# Altium footprint library En.PcbLib: 157 footprints (part 9 of 10)
Each footprint in its own frame and in the unit in brackets; x right, y up, seen from the top. Pads: shape width x height; smd on the part's side, far side on the other; paste and mask are expansions set on the pad; w line width, h text height; cw(c..) or ccw(c..) is an arc to the next point about the centre after c.
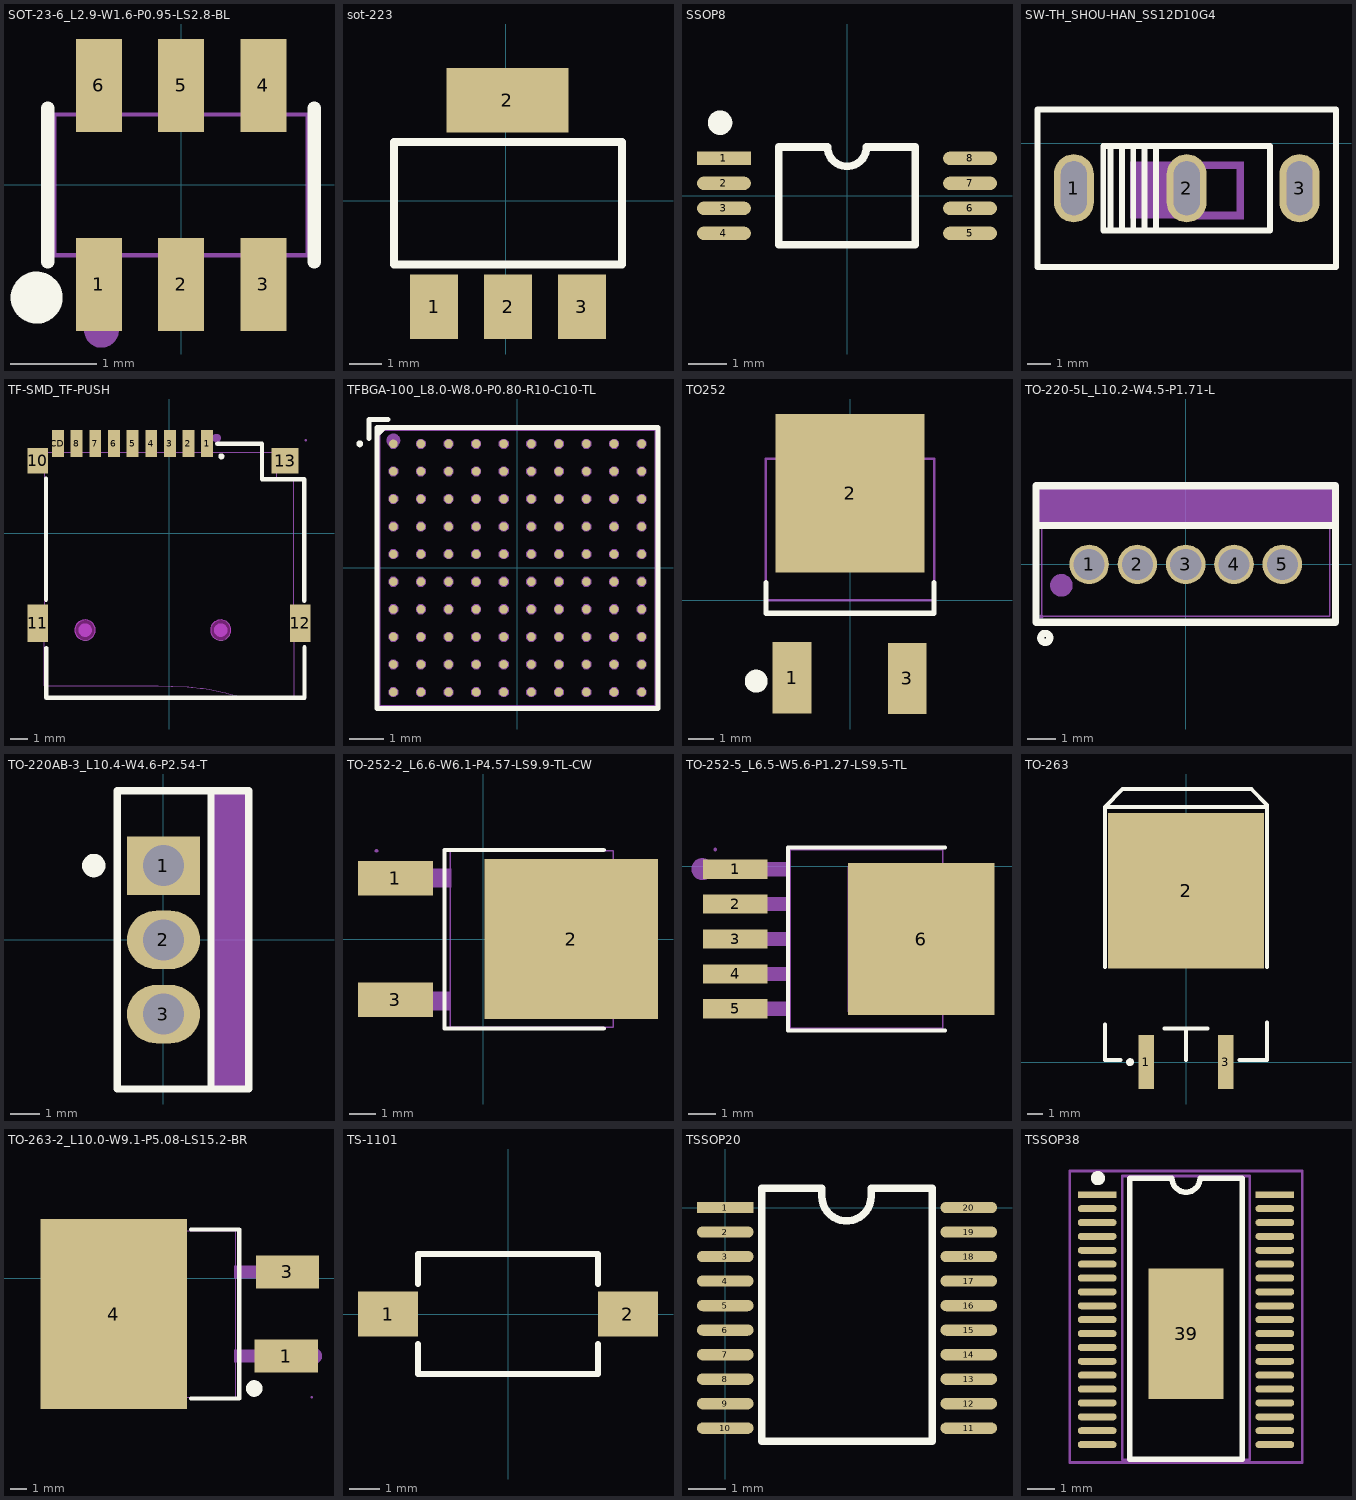
[diagram p8: the footprints below, top view; thin cyan lines are the x and y axes]

## SOT-23-6_L2.9-W1.6-P0.95-LS2.8-BL [mm]
pads (6):
  rect 0.532x1.072 smd: 1(-0.95,-1.149) 2(0,-1.149) 3(0.95,-1.149) 4(0.95,1.149) 5(0,1.149) 6(-0.95,1.149)
Top Overlay:
  circle w0.3: c-1.668,-1.301 r0.15
  lines w0.152: -1.539,-0.889 -1.539,0.889 ; 1.539,-0.889 1.539,0.889
Mechanical 6:
  circle w0.2: c-0.92,-1.68 r0.1
Mechanical 15:
  region: -1.403,-1.4 -1.404,-1.376 -1.439,-1.341 -1.488,-1.341 -1.522,-1.376 -1.523,-1.4 -1.522,-1.425 -1.487,-1.459 -1.438,-1.459 -1.404,-1.424
  region: -1.165,-0.925 -0.735,-0.925 -0.735,-1.4 -1.165,-1.4
  region: -1.165,-0.803 -0.735,-0.803 -0.735,-0.935 -1.165,-0.935
  region: -0.215,-0.925 0.215,-0.925 0.215,-1.4 -0.215,-1.4
  region: -0.215,-0.803 0.215,-0.803 0.215,-0.935 -0.215,-0.935
  region: 0.735,-0.925 1.165,-0.925 1.165,-1.4 0.735,-1.4
  region: 0.735,-0.803 1.165,-0.803 1.165,-0.935 0.735,-0.935
  region: 0.735,0.925 1.165,0.925 1.165,1.4 0.735,1.4
  region: 0.735,0.935 1.165,0.935 1.165,0.803 0.735,0.803
  region: -0.215,0.925 0.215,0.925 0.215,1.4 -0.215,1.4
  region: -0.215,0.935 0.215,0.935 0.215,0.803 -0.215,0.803
  region: -1.165,0.925 -0.735,0.925 -0.735,1.4 -1.165,1.4
  region: -1.165,0.935 -0.735,0.935 -0.735,0.803 -1.165,0.803
  lines w0.051: -1.463,-0.813 1.463,-0.813 1.463,0.813 -1.463,0.813 -1.463,-0.813
3D body "User Library-SOT-23-6.SLDPRT": height 1.09, standoff 0, extent -1.397,-1.213 1.397,1.213

## sot-223 [mil]
pads (4):
  rect 59x79 smd: 1(-88,-130) 2(2.55,-130) 3(93.1,-130)
  rect 150x79 smd: 2(1.88,123.54)
Top Overlay:
  lines w10: -137.45,-78 142.55,-78 142.55,72 -137.45,72 -137.45,-78
3D body "SOT-223_MP04A.STEP": height 66.93, standoff 0, extent -126.41,-138.72 129.5,135.3

## SSOP8 [mm] "3*6.4*1.2mm（蒜米工坊）"
height 9.4
pads (8):
  rect 1.4x0.35 smd: 1(-3.2,0.975)
  oval 1.4x0.35 smd: 2(-3.2,0.325) 3(-3.2,-0.325) 4(-3.2,-0.975) 5(3.2,-0.975) 6(3.2,-0.325) 7(3.2,0.325) 8(3.2,0.975)
Top Overlay:
  circle w0.381: c-3.3,1.9 r0.127
  lines w0.2: -1.778,-1.27 1.778,-1.27 1.778,1.27 0.508,1.27 cw(c0,1.27) -0.508,1.27 -1.778,1.27 -1.778,-1.27
3D body "SSOP8.STEP": height 1.25, standoff -0.03, extent -3.202,-1.75 3.202,1.75

## SW-TH_SHOU-HAN_SS12D10G4 [mm]
pads (3):
  oval 1.7x2.9 hole 1.1 slot 2.3 at 90 deg paste-2539.97 mask+0.05: 1(23.327,-1.924) 2(28.127,-1.924) 3(32.927,-1.924)
Top Overlay:
  lines w0.254: 24.885,-3.724 24.894,-3.724 24.894,-0.124 ; 25.365,-3.724 25.374,-3.724 25.374,-0.124 ; 25.844,-3.724 25.854,-3.724 25.854,-0.124 ; 26.324,-3.724 26.334,-3.724 26.334,-0.124 ; 26.813,-0.124 26.813,-3.724 26.87,-3.724 ; 30.444,-0.124 30.867,-0.124 ; 30.577,-0.124 24.577,-0.124 24.577,-3.724 31.677,-3.724 31.677,-0.624 31.677,-0.124 30.677,-0.124 ; 21.777,-5.274 34.477,-5.274 34.477,1.426 21.777,1.426 21.777,-5.274
Mechanical 6:
  region: 28.107,-3.225 28.107,-0.825 28.107,-0.787 28.411,-0.787 28.411,-3.227 28.311,-3.227
  region: 28.106,-2.931 30.506,-2.931 30.543,-2.931 30.543,-3.235 28.104,-3.235 28.104,-3.134
  region: 30.251,-3.235 30.251,-0.835 30.251,-0.797 30.555,-0.797 30.555,-3.237 30.454,-3.237
  region: 28.114,-0.795 30.514,-0.795 30.552,-0.795 30.552,-1.098 28.112,-1.098 28.112,-0.998
  region: 25.727,-0.794 28.127,-0.794 28.127,-3.194 25.727,-3.194
Mechanical 15:
  region: 32.527,-1.274 33.327,-1.274 33.327,-2.574 32.527,-2.574
  region: 27.727,-1.274 28.527,-1.274 28.527,-2.574 27.727,-2.574
  region: 22.927,-1.274 23.727,-1.274 23.727,-2.574 22.927,-2.574
  region: 21.837,-5.274 21.837,-5.249 21.802,-5.214 21.752,-5.214 21.717,-5.249 21.717,-5.274 21.717,-5.299 21.752,-5.334 21.802,-5.334 21.837,-5.299
  lines w0.051: 21.777,-5.274 34.477,-5.274 34.477,1.426 21.777,1.426 21.777,-5.274
3D body "User Library-SS-12D10L4.step": height 10.1, standoff -7, extent 21.567,-5.276 34.567,1.524

## TF-SMD_TF-PUSH [mm]
pads (13):
  rect 0.7x1.6 smd: 1(2.25,5.3) 2(1.15,5.3) 3(0.05,5.3) 4(-1.05,5.3) 5(-2.15,5.3) 6(-3.25,5.3) 7(-4.35,5.3) 8(-5.45,5.3) CD(-6.55,5.3)
  rect 1.2x1.5 smd: 10(-7.75,4.3)
  rect 1.2x2.2 smd: 11(-7.75,-5.3) 12(7.75,-5.3)
  rect 1.6x1.5 smd: 13(6.85,4.3)
Top Overlay:
  circle w0.254: c3.087,4.552 r0.052
  lines w0.254: -7.26,-3.91 -7.26,3.25 ; -7.24,-6.76 -7.24,-9.7 8,-9.7 8,-6.71 ; 2.85,5.3 4.702,5.3 5.489,5.3 5.489,3.199 5.5,3.2 ; 5.49,3.2 7.98,3.2 7.98,-3.969
Keep-Out Layer:
  board cut-out: 3.65,-5.7 3.65,-5.581 3.559,-5.36 3.39,-5.191 3.169,-5.1 2.931,-5.1 2.71,-5.191 2.541,-5.36 2.45,-5.581 2.45,-5.7 2.45,-5.819 2.541,-6.04 2.71,-6.209 2.931,-6.3 3.169,-6.3 3.39,-6.209 3.559,-6.04 3.65,-5.819
  board cut-out: -4.35,-5.7 -4.35,-5.581 -4.441,-5.36 -4.61,-5.191 -4.831,-5.1 -5.069,-5.1 -5.29,-5.191 -5.459,-5.36 -5.55,-5.581 -5.55,-5.7 -5.55,-5.819 -5.459,-6.04 -5.29,-6.209 -5.069,-6.3 -4.831,-6.3 -4.61,-6.209 -4.441,-6.04 -4.35,-5.819
Mechanical 1:
  circle w0.005: c3.05,-5.7 r0.6
  circle w0.005: c-4.95,-5.7 r0.6
Mechanical 6:
  circle w0.254: c2.81,5.63 r0.127
  circle w0.4: c-4.95,-5.7 r0.2
  circle w0.4: c3.05,-5.7 r0.2
Mechanical 15:
  region: 8.069,-6.092 8.068,-4.492 7.369,-4.492 7.369,-6.091 7.429,-6.091
  region: -7.369,-6.094 -7.37,-4.494 -8.069,-4.494 -8.069,-6.094 -8.009,-6.094
  region: 6.481,3.805 7.181,3.805 7.181,4.805 6.494,4.805 6.469,4.806 6.472,4.752 6.473,4.671 6.474,4.498
  region: -7.37,3.806 -8.069,3.806 -8.07,4.806 -7.383,4.806 -7.382,4.805 -7.384,4.498
  region: 2.1,5.505 2.4,5.505 2.4,4.805 2.1,4.805
  region: 1,5.505 1.3,5.505 1.3,4.805 1,4.805
  region: -0.1,5.505 0.2,5.505 0.2,4.805 -0.1,4.805
  region: -1.2,5.505 -0.9,5.505 -0.9,4.805 -1.2,4.805
  region: -2.3,5.505 -2,5.505 -2,4.805 -2.3,4.805
  region: -3.4,5.505 -3.1,5.505 -3.1,4.805 -3.4,4.805
  region: -4.5,5.505 -4.2,5.505 -4.2,4.805 -4.5,4.805
  region: -5.6,5.505 -5.3,5.505 -5.3,4.805 -5.6,4.805
  region: -6.7,5.505 -6.4,5.505 -6.4,4.805 -6.7,4.805
  region: 8.13,5.505 8.129,5.529 8.094,5.562 8.046,5.562 8.011,5.529 8.01,5.505 8.011,5.481 8.046,5.448 8.094,5.448 8.129,5.481
  lines w0.051: -8.07,4.806 7.181,4.806 ; -8.07,4.806 -8.07,4.806 ; -8.07,4.806 -8.07,3.806 -7.37,3.806 -7.37,-4.494 -8.07,-4.494 -8.07,-6.094 -7.37,-6.094 -7.37,-8.994 -6.352,-8.995 -2.476,-8.986 -1.695,-8.99 -0.648,-8.989 0.138,-8.999 0.232,-9.003 1.09,-9.042 1.163,-9.05 1.308,-9.069 1.414,-9.075 1.841,-9.121 2.012,-9.136 2.38,-9.204 3.048,-9.34 3.176,-9.371 3.348,-9.403 3.411,-9.421 3.876,-9.552 4.14,-9.628 4.388,-9.695 4.389,-9.694 7.379,-9.694 7.38,-9.693 7.38,-6.094 8.07,-6.094 ; 7.181,4.806 7.181,3.806 7.181,3.806 6.33,3.806 6.33,3.306 7.229,3.306 7.229,3.206 7.37,3.206 7.37,-4.494 7.37,-4.494 8.069,-4.494 8.07,-4.495 8.07,-6.094 ; 7.181,4.806 7.181,4.806 ; 8.07,-6.094 8.07,-6.094
3D body "User Library-MEM2055-00-190-01-A_revG.SLDPRT": height 1.85, standoff -0.6, extent -8.066,-9.652 7.934,5.598

## TFBGA-100_L8.0-W8.0-P0.80-R10-C10-TL [mm]
pads (100):
  round 0.25 smd paste+0 mask+0.038: A1(-3.6,3.6) A2(-2.8,3.6) A3(-2,3.6) A4(-1.2,3.6) A5(-0.4,3.6) A6(0.4,3.6) A7(1.2,3.6) A8(2,3.6) A9(2.8,3.6) A10(3.6,3.6) B1(-3.6,2.8) B2(-2.8,2.8) B3(-2,2.8) B4(-1.2,2.8) B5(-0.4,2.8) B6(0.4,2.8) B7(1.2,2.8) B8(2,2.8) B9(2.8,2.8) B10(3.6,2.8) C1(-3.6,2) C2(-2.8,2) C3(-2,2) C4(-1.2,2) C5(-0.4,2) C6(0.4,2) C7(1.2,2) C8(2,2) C9(2.8,2) C10(3.6,2) D1(-3.6,1.2) D2(-2.8,1.2) D3(-2,1.2) D4(-1.2,1.2) D5(-0.4,1.2) D6(0.4,1.2) D7(1.2,1.2) D8(2,1.2) D9(2.8,1.2) D10(3.6,1.2) E1(-3.6,0.4) E2(-2.8,0.4) E3(-2,0.4) E4(-1.2,0.4) E5(-0.4,0.4) E6(0.4,0.4) E7(1.2,0.4) E8(2,0.4) E9(2.8,0.4) E10(3.6,0.4) F1(-3.6,-0.4) F2(-2.8,-0.4) F3(-2,-0.4) F4(-1.2,-0.4) F5(-0.4,-0.4) F6(0.4,-0.4) F7(1.2,-0.4) F8(2,-0.4) F9(2.8,-0.4) F10(3.6,-0.4) G1(-3.6,-1.2) G2(-2.8,-1.2) G3(-2,-1.2) G4(-1.2,-1.2) G5(-0.4,-1.2) G6(0.4,-1.2) G7(1.2,-1.2) G8(2,-1.2) G9(2.8,-1.2) G10(3.6,-1.2) H1(-3.6,-2) H2(-2.8,-2) H3(-2,-2) H4(-1.2,-2) H5(-0.4,-2) H6(0.4,-2) H7(1.2,-2) H8(2,-2) H9(2.8,-2) H10(3.6,-2) J1(-3.6,-2.8) J2(-2.8,-2.8) J3(-2,-2.8) J4(-1.2,-2.8) J5(-0.4,-2.8) J6(0.4,-2.8) J7(1.2,-2.8) J8(2,-2.8) J9(2.8,-2.8) J10(3.6,-2.8) K1(-3.6,-3.6) K2(-2.8,-3.6) K3(-2,-3.6) K4(-1.2,-3.6) K5(-0.4,-3.6) K6(0.4,-3.6) K7(1.2,-3.6) K8(2,-3.6) K9(2.8,-3.6) K10(3.6,-3.6)
Top Overlay:
  circle w0.1: c-4.576,3.6 r0.05
  region: -4.076,4.076 -3.756,4.076 -4.076,3.756
  lines w0.152: -4.305,3.756 -4.305,4.305 -3.756,4.305 ; -4.076,-4.076 4.076,-4.076 4.076,4.076 -4.076,4.076 -4.076,-4.076
Mechanical 6:
  circle w0.2: c-3.6,3.7 r0.1
  region: -4.076,4.076 -3.756,4.076 -4.076,3.756
Mechanical 15:
  drawing of 105 lines, arcs and shapes, not listed
3D body "stm32h723vgh6.step": height 1.1, standoff 0, extent -4,-4 4,4

## TO252 [mil] "252晶体管"
height 370.08
pads (3):
  rect 60x110 smd: 1(-89.55,-119.77) 3(88.45,-120.77)
  rect 230x245 smd: 2(0,165.35)
Top Overlay:
  circle w19.68: c-145,-125 r7.87
  lines w7.87: -130,27.56 -130,-20 130,-20 130,27.56
Mechanical 15:
  lines w3.94: -105.04,218.5 -105.04,236.06 -65.59,271.65 65.59,271.65 105.04,236.06 105.04,218.5 ; -130,0 130,0 130,218.5 -130,218.5 -130,0
3D body "TO252.STEP": height 90.55, standoff -0.2, extent -127.95,-120 127.95,250.84

## TO-220-5L_L10.2-W4.5-P1.71-L [mm]
pads (5):
  round 1.4 hole 1.1: 1(-3.42,0) 2(-1.71,0) 3(0,0) 4(1.71,0) 5(3.42,0)
Top Overlay:
  circle w0.254: c-4.97,-2.6 r0.16
  lines w0.258: -5.3,1.38 5.3,1.38 ; -5.3,-2.05 -5.3,2.78 5.3,2.78 5.3,-2.05 -5.3,-2.05
Mechanical 6:
  circle w0.4: c-4.4,-0.74 r0.2
  region: -5.24,2.79 5.3,2.79 5.31,2.78 5.31,1.43 5.32,1.42 -5.24,1.42 -5.25,1.41
Mechanical 15:
  region: -2.975,-0.25 -3.865,-0.25 -3.865,0.25 -2.975,0.25
  region: -1.265,-0.25 -2.155,-0.25 -2.155,0.25 -1.265,0.25
  region: 0.445,-0.25 -0.445,-0.25 -0.445,0.25 0.445,0.25
  region: 2.155,-0.25 1.265,-0.25 1.265,0.25 2.155,0.25
  region: 3.865,-0.25 2.975,-0.25 2.975,0.25 3.865,0.25
  region: -5.04,-1.84 -5.04,-1.815 -5.075,-1.78 -5.125,-1.78 -5.16,-1.815 -5.16,-1.84 -5.16,-1.865 -5.125,-1.9 -5.075,-1.9 -5.04,-1.865
  lines w0.051: -5.1,-1.84 -5.1,2.66 5.1,2.66 5.1,-1.84 -5.1,-1.84
3D body "User Library-TO220-5T PCB.SLDPRT": height 21.32, standoff -2.25, extent -5.06,-1.651 5.06,2.806
3D body "User Library-HS3_16x23x25.SLDPRT": height 25.01, standoff -4, extent -11.443,-4.062 11.557,11.938

## TO-220AB-3_L10.4-W4.6-P2.54-T [mm]
pads (3):
  rect 2.5x2 hole 1.4: 1(0,2.54)
  oval 2.5x2 hole 1.4: 2(0,0) 3(0,-2.54)
Top Overlay:
  lines w0.254: 1.625,-5.1 1.625,5.1 ; -1.579,-5.1 2.921,-5.1 2.921,5.1 -1.579,5.1 -1.579,-5.1
  lines w0.4: -2.18,2.537 cw(c-2.38,2.539) -2.18,2.54
Mechanical 6:
  region: 1.651,5.08 1.651,-5.08 2.921,-5.08 2.921,5.08
Mechanical 15:
  region: 2.96,5.1 2.959,5.124 2.924,5.157 2.876,5.157 2.841,5.124 2.84,5.1 2.841,5.076 2.876,5.042 2.924,5.042 2.959,5.076
  region: 0.6,0 0.599,0.118 0.506,0.337 0.338,0.503 0.119,0.593 -0.118,0.593 -0.338,0.503 -0.506,0.337 -0.599,0.119 -0.6,0 -0.599,-0.118 -0.506,-0.336 -0.338,-0.503 -0.118,-0.593 0.118,-0.593 0.338,-0.503 0.506,-0.337 0.599,-0.118
  region: 0.6,-2.54 0.599,-2.422 0.506,-2.203 0.338,-2.037 0.119,-1.947 -0.118,-1.947 -0.338,-2.037 -0.506,-2.203 -0.599,-2.421 -0.6,-2.54 -0.599,-2.658 -0.506,-2.876 -0.338,-3.043 -0.118,-3.133 0.118,-3.133 0.338,-3.043 0.506,-2.877 0.599,-2.658
  region: 0.6,2.54 0.599,2.658 0.506,2.877 0.338,3.043 0.119,3.133 -0.118,3.133 -0.338,3.043 -0.506,2.877 -0.599,2.659 -0.6,2.54 -0.599,2.422 -0.506,2.204 -0.338,2.037 -0.118,1.947 0.118,1.947 0.338,2.037 0.506,2.203 0.599,2.422
  lines w0.051: -1.6,-5.1 2.9,-5.1 2.9,5.1 -1.6,5.1 -1.6,-5.1
3D body "User Library-TO-220 Con Disipador 34M8491_TO220-SHORT.SLDPRT": height 21.71, standoff -3.09, extent -1.397,-5.28 3.293,5.28
3D body "User Library-TO-220 Con Disipador 34M8491_Disipador 34M8491.SLDPRT": height 25.4, standoff -3.1, extent 1.881,-5.919 8.382,6.681

## TO-252-2_L6.6-W6.1-P4.57-LS9.9-TL-CW [mm]
pads (3):
  rect 2.8x1.3 smd: 1(-3.292,2.273) 3(-3.292,-2.273)
  rect 6.5x6 smd: 2(3.292,0)
Top Overlay:
  lines w0.152: 4.511,-3.353 -1.456,-3.353 -1.456,3.34 4.511,3.34
Mechanical 6:
  circle w0.6: c-3.962,2.286 r0.3
Mechanical 15:
  region: -2.448,1.93 -2.448,2.629 -1.198,2.629 -1.198,1.93
  region: -2.474,-2.667 -2.474,-1.968 -1.224,-1.968 -1.224,-2.667
  region: -3.998,1.93 -3.998,2.629 -2.408,2.629 -2.408,1.93
  region: -3.998,-2.667 -3.998,-1.968 -2.408,-1.968 -2.408,-2.667
  region: 0.727,-2.667 0.727,2.668 5.403,2.668 5.937,2.135 5.937,-2.133 5.403,-2.667
  region: -3.938,3.3 -3.939,3.324 -3.974,3.358 -4.022,3.357 -4.057,3.324 -4.058,3.3 -4.057,3.276 -4.022,3.242 -3.974,3.242 -3.939,3.276
  lines w0.051: -1.231,-3.3 4.869,-3.3 4.869,3.3 -1.231,3.3 -1.231,-3.3
3D body "User Library-TO252-2_TO252-21.sldprt": height 2.29, standoff 0, extent -0.635,-3.302 5.465,3.278
3D body "User Library-TO252-2_TO252-22.sldprt": height 1.57, standoff 1.07, extent -1.389,-0.4 -0.389,0.4
3D body "User Library-TO252-2_TO252-23.sldprt": height 1.57, standoff 0, extent -3.402,1.905 -0.662,2.705
3D body "User Library-TO252-2_TO252-23.sldprt": height 1.57, standoff 0, extent -3.402,-2.705 -0.662,-1.905
3D body "User Library-TO252-2_TO252-25.sldprt": height 0.5, standoff 0, extent 1.267,-2.598 6.477,2.852

## TO-252-5_L6.5-W5.6-P1.27-LS9.5-TL [mm]
pads (6):
  rect 2.357x0.7 smd: 1(28.19,-0.103) 2(28.19,-1.373) 3(28.19,-2.643) 4(28.19,-3.913) 5(28.19,-5.183)
  rect 5.324x5.512 smd: 6(34.948,-2.643)
Top Overlay:
  lines w0.152: 35.812,-5.969 30.109,-5.969 30.109,0.683 35.812,0.683
Mechanical 6:
  circle w0.4: c26.997,-0.103 r0.2
Mechanical 15:
  region: 32.286,-5.293 32.286,0.007 36.631,0.007 37.161,-0.523 37.161,-4.763 36.631,-5.293
  region: 29.041,-5.433 29.041,-4.933 30.196,-4.933 30.196,-5.433
  region: 27.461,-5.433 27.461,-4.933 29.051,-4.933 29.051,-5.433
  region: 29.041,-4.163 29.041,-3.663 30.196,-3.663 30.196,-4.163
  region: 27.461,-4.163 27.461,-3.663 29.051,-3.663 29.051,-4.163
  region: 29.041,-2.893 29.041,-2.393 30.196,-2.393 30.196,-2.893
  region: 27.461,-2.893 27.461,-2.393 29.051,-2.393 29.051,-2.893
  region: 29.041,-1.623 29.041,-1.123 30.196,-1.123 30.196,-1.623
  region: 27.461,-1.623 27.461,-1.123 29.051,-1.123 29.051,-1.623
  region: 29.041,-0.353 29.041,0.147 30.196,0.147 30.196,-0.353
  region: 27.461,-0.353 27.461,0.147 29.051,0.147 29.051,-0.353
  region: 27.521,0.607 27.521,0.632 27.486,0.667 27.436,0.667 27.401,0.632 27.401,0.607 27.401,0.582 27.436,0.547 27.486,0.547 27.521,0.582
  lines w0.051: 30.186,-5.893 35.736,-5.893 35.736,0.607 30.186,0.607 30.186,-5.893
3D body "User Library-DPAK-5-1.SLDPRT": height 2.4, standoff -0.01, extent 27.216,-5.89 38.082,0.81

## TO-263 [mm]
pads (3):
  rect 1x3.45 smd: 1(-2.54,0) 3(2.54,0)
  rect 10x10 smd: 2(0,11)
Top Overlay:
  circle w0.25: c-3.59,0 r0.125
  lines w0.254: -5.207,2.413 -5.207,0.127 -4.191,0.127 ; -5.207,6.096 -5.207,16.385 ; -1.397,2.159 1.397,2.159 ; 0,0.127 0,2.159 ; 3.429,0.127 5.207,0.127 5.207,2.54 ; 5.207,6.096 5.207,16.385 -5.207,16.385 ; 5.207,16.51 4.189,17.528 -4.064,17.528 -5.207,16.385
3D body "SW3dPS-DPAK.STEP": height 4.88, standoff -0.13, extent -5.08,-0.653 5.08,14.611

## TO-263-2_L10.0-W9.1-P5.08-LS15.2-BR [mm]
pads (3):
  rect 3.81x2 smd: 1(59.388,-4.699) 3(59.459,0.381)
  rect 8.84x11.43 smd: 4(48.997,-2.159)
Top Overlay:
  circle w0.5: c57.458,-6.649 r0.25
  lines w0.254: 53.648,-7.245 56.562,-7.245 56.562,2.927 53.648,2.927
Mechanical 6:
  circle w0.5: c61.048,-4.699 r0.25
Mechanical 15:
  region: 60.988,-7.169 60.987,-7.145 60.952,-7.11 60.904,-7.11 60.869,-7.144 60.868,-7.169 60.869,-7.193 60.904,-7.227 60.952,-7.227 60.987,-7.193
  region: 52.247,2.851 52.247,-7.169 46.749,-7.169 45.747,-6.167 45.747,1.849 46.749,2.851
  region: 58.47,-4.324 60.928,-4.324 60.928,-5.074 58.47,-5.074
  region: 58.47,0.756 60.928,0.756 60.928,0.006 58.47,0.006
  region: 58.544,-5.074 56.244,-5.074 56.244,-4.324 58.544,-4.324
  region: 58.544,0.006 56.244,0.006 56.244,0.756 58.544,0.756
  lines w0.051: 47.147,-7.169 56.342,-7.169 56.342,2.851 47.147,2.851 47.147,-7.169
3D body "SW3dPS-DPAK.STEP": height 4.88, standoff -0.13, extent 45.714,-7.112 60.978,3.048

## TS-1101 [mm]
pads (2):
  rect 2x1.5 smd: 1(-4,0) 2(4,0)
Top Overlay:
  lines w0.2: -3,-1 -3,-2 3,-2 3,-1 ; -3,1 -3,2 3,2 3,1
3D body "TS-1101-X-X.stp": height 2.5, standoff 0, extent -4,-1.8 4,1.8

## TSSOP20 [mm]
pads (20):
  rect 1.5x0.3 smd: 1(0,0)
  oval 1.5x0.3 smd: 2(0,-0.65) 3(0,-1.3) 4(0,-1.95) 5(0,-2.6) 6(0,-3.25) 7(0,-3.9) 8(0,-4.55) 9(0,-5.2) 10(0,-5.85) 11(6.454,-5.85) 12(6.454,-5.2) 13(6.454,-4.55) 14(6.454,-3.9) 15(6.454,-3.25) 16(6.454,-2.6) 17(6.454,-1.95) 18(6.454,-1.3) 19(6.454,-0.65) 20(6.454,0)
Top Overlay:
  lines w0.2: 0.965,-6.2 0.965,0.508 2.559,0.508 2.559,0.3 ccw(c3.214,0.3) 3.87,0.3 3.87,0.508 5.486,0.508 5.486,-6.2 0.965,-6.2
3D body "TSSOP-20.STEP": height 1.2, standoff 0, extent -0.049,-6.221 6.501,0.379

## TSSOP38 [mm]
pads (39):
  rect 1.4x0.25 smd: 1(8.23,-10.486) 38(14.63,-10.486)
  oval 1.4x0.25 smd: 2(8.23,-10.986) 3(8.23,-11.486) 4(8.23,-11.986) 5(8.23,-12.486) 6(8.23,-12.986) 7(8.23,-13.486) 8(8.23,-13.986) 9(8.23,-14.486) 10(8.23,-14.986) 11(8.23,-15.486) 12(8.23,-15.986) 13(8.23,-16.486) 14(8.23,-16.986) 15(8.23,-17.486) 16(8.23,-17.986) 17(8.23,-18.486) 18(8.23,-18.986) 19(8.23,-19.486) 20(14.63,-19.486) 21(14.63,-18.986) 22(14.63,-18.486) 23(14.63,-17.986) 24(14.63,-17.486) 25(14.63,-16.986) 26(14.63,-16.486) 27(14.63,-15.986) 28(14.63,-15.486) 29(14.63,-14.986) 30(14.63,-14.486) 31(14.63,-13.986) 32(14.63,-13.486) 33(14.63,-12.986) 34(14.63,-12.486) 35(14.63,-11.986) 36(14.63,-11.486) 37(14.63,-10.986)
  rect 2.7x4.7 smd: 39(11.43,-15.494)
Top Overlay:
  circle w0.254: c8.255,-9.885 r0.13
  lines w0.2: 9.398,-20.011 10.414,-20.011 12.446,-20.011 13.462,-20.011 ; 9.398,-19.961 9.398,-9.885 10.922,-9.885 ccw(c11.43,-9.885) 11.938,-9.885 13.462,-9.885 13.462,-19.961
Top Solder:
  lines w0.251: 10.13,-14.986 11.43,-14.986 ; 11.43,-17.336 11.43,-14.986 ; 12.73,-14.986 11.43,-14.986
Mechanical 13:
  lines w0.1: 9.13,-20.036 9.13,-9.811 13.73,-9.811 13.73,-20.036 9.13,-20.036
Mechanical 15:
  circle w0.05: c11.43,-14.711 r0.35
  lines w0.05: 10.93,-14.711 11.93,-14.711 ; 11.43,-15.211 11.43,-14.211
  lines w0.1: 7.239,-20.136 7.239,-9.631 15.621,-9.631 15.621,-20.136 7.239,-20.136
3D body "User Library-TSSOP-38_Board2.sldprt": height 0.42, standoff 0, extent 11.684,-14.86 11.685,-14.859
3D body "User Library-TSSOP-38_Board2.sldprt": height 0.42, standoff 0, extent 17.018,-20.321 17.019,-20.32
3D body "User Library-TSSOP-38_Board2.sldprt": height 0.42, standoff 0, extent 11.43,-11.812 11.431,-11.811
3D body "User Library-TSSOP-38_Board2.sldprt": height 0.42, standoff 0, extent 20.066,-14.225 20.067,-14.224
3D body "User Library-TSSOP-38_Board2.sldprt": height 0.42, standoff 0, extent 20.701,-18.289 20.702,-18.288
3D body "User Library-TSSOP-38_Board3.sldprt": height 0.11, standoff 0, extent 3.556,-12.329 3.566,-12.319
3D body "User Library-TSSOP-38_Board3.sldprt": height 0.11, standoff 0, extent 5.588,-16.647 5.598,-16.637
3D body "User Library-TSSOP-38_Extruded3.sldprt": height 1.03, standoff 0.08, extent 9.18,-19.963 13.68,-10.263
3D body "User Library-TSSOP-38_Extruded2.sldprt": height 0.62, standoff -0.01, extent 13.674,-19.609 14.774,-19.359
3D body "User Library-TSSOP-38_Extruded2.sldprt": height 0.62, standoff -0.01, extent 13.674,-19.108 14.774,-18.858
3D body "User Library-TSSOP-38_Extruded2.sldprt": height 0.62, standoff -0.01, extent 13.674,-18.607 14.774,-18.357
3D body "User Library-TSSOP-38_Extruded2.sldprt": height 0.62, standoff -0.01, extent 13.674,-18.106 14.774,-17.856
3D body "User Library-TSSOP-38_Extruded2.sldprt": height 0.62, standoff -0.01, extent 13.674,-17.104 14.774,-16.854
3D body "User Library-TSSOP-38_Extruded2.sldprt": height 0.62, standoff -0.01, extent 13.674,-17.605 14.774,-17.355
3D body "User Library-TSSOP-38_Extruded2.sldprt": height 0.62, standoff -0.01, extent 13.674,-16.603 14.774,-16.353
3D body "User Library-TSSOP-38_Extruded2.sldprt": height 0.62, standoff -0.01, extent 13.674,-16.102 14.774,-15.852
3D body "User Library-TSSOP-38_Extruded2.sldprt": height 0.62, standoff -0.01, extent 13.674,-15.601 14.774,-15.351
3D body "User Library-TSSOP-38_Extruded2.sldprt": height 0.62, standoff -0.01, extent 13.674,-15.1 14.774,-14.85
3D body "User Library-TSSOP-38_Extruded2.sldprt": height 0.62, standoff -0.01, extent 13.674,-14.599 14.774,-14.349
3D body "User Library-TSSOP-38_Extruded2.sldprt": height 0.62, standoff -0.01, extent 13.674,-14.098 14.774,-13.848
3D body "User Library-TSSOP-38_Extruded2.sldprt": height 0.62, standoff -0.01, extent 13.674,-13.597 14.774,-13.347
3D body "User Library-TSSOP-38_Extruded2.sldprt": height 0.62, standoff -0.01, extent 13.674,-13.097 14.774,-12.847
3D body "User Library-TSSOP-38_Extruded2.sldprt": height 0.62, standoff -0.01, extent 13.674,-12.596 14.774,-12.346
3D body "User Library-TSSOP-38_Extruded2.sldprt": height 0.62, standoff -0.01, extent 13.674,-12.095 14.774,-11.845
3D body "User Library-TSSOP-38_Extruded2.sldprt": height 0.62, standoff -0.01, extent 13.674,-11.093 14.774,-10.843
3D body "User Library-TSSOP-38_Extruded2.sldprt": height 0.62, standoff -0.01, extent 13.674,-11.594 14.774,-11.344
3D body "User Library-TSSOP-38_Extruded2.sldprt": height 0.62, standoff -0.01, extent 13.674,-10.592 14.774,-10.342
3D body "User Library-TSSOP-38_Extruded2.sldprt": height 0.62, standoff -0.01, extent 8.086,-10.613 9.186,-10.363
3D body "User Library-TSSOP-38_Extruded2.sldprt": height 0.62, standoff -0.01, extent 8.086,-11.114 9.186,-10.864
3D body "User Library-TSSOP-38_Extruded2.sldprt": height 0.62, standoff -0.01, extent 8.086,-11.615 9.186,-11.365
3D body "User Library-TSSOP-38_Extruded2.sldprt": height 0.62, standoff -0.01, extent 8.086,-12.116 9.186,-11.866
3D body "User Library-TSSOP-38_Extruded2.sldprt": height 0.62, standoff -0.01, extent 8.086,-13.118 9.186,-12.868
3D body "User Library-TSSOP-38_Extruded2.sldprt": height 0.62, standoff -0.01, extent 8.086,-12.617 9.186,-12.367
3D body "User Library-TSSOP-38_Extruded2.sldprt": height 0.62, standoff -0.01, extent 8.086,-13.619 9.186,-13.369
3D body "User Library-TSSOP-38_Extruded2.sldprt": height 0.62, standoff -0.01, extent 8.086,-14.12 9.186,-13.87
3D body "User Library-TSSOP-38_Extruded2.sldprt": height 0.62, standoff -0.01, extent 8.086,-14.621 9.186,-14.371
3D body "User Library-TSSOP-38_Extruded2.sldprt": height 0.62, standoff -0.01, extent 8.086,-15.122 9.186,-14.872
3D body "User Library-TSSOP-38_Extruded2.sldprt": height 0.62, standoff -0.01, extent 8.086,-15.623 9.186,-15.373
3D body "User Library-TSSOP-38_Extruded2.sldprt": height 0.62, standoff -0.01, extent 8.086,-16.124 9.186,-15.874
3D body "User Library-TSSOP-38_Extruded2.sldprt": height 0.62, standoff -0.01, extent 8.086,-16.625 9.186,-16.375
3D body "User Library-TSSOP-38_Extruded2.sldprt": height 0.62, standoff -0.01, extent 8.086,-17.125 9.186,-16.875
3D body "User Library-TSSOP-38_Extruded2.sldprt": height 0.62, standoff -0.01, extent 8.086,-17.626 9.186,-17.376
3D body "User Library-TSSOP-38_Extruded2.sldprt": height 0.62, standoff -0.01, extent 8.086,-18.127 9.186,-17.877
3D body "User Library-TSSOP-38_Extruded2.sldprt": height 0.62, standoff -0.01, extent 8.086,-19.129 9.186,-18.879
3D body "User Library-TSSOP-38_Extruded2.sldprt": height 0.62, standoff -0.01, extent 8.086,-18.628 9.186,-18.378
3D body "User Library-TSSOP-38_Extruded2.sldprt": height 0.62, standoff -0.01, extent 8.086,-19.63 9.186,-19.38